# Altium footprint library Connectors.PcbLib: 104 footprints (part 7 of 7)
Each footprint in its own frame and in the unit in brackets; x right, y up, seen from the top. Pads: shape width x height; smd on the part's side, far side on the other; paste and mask are expansions set on the pad; w line width, h text height; cw(c..) or ccw(c..) is an arc to the next point about the centre after c.
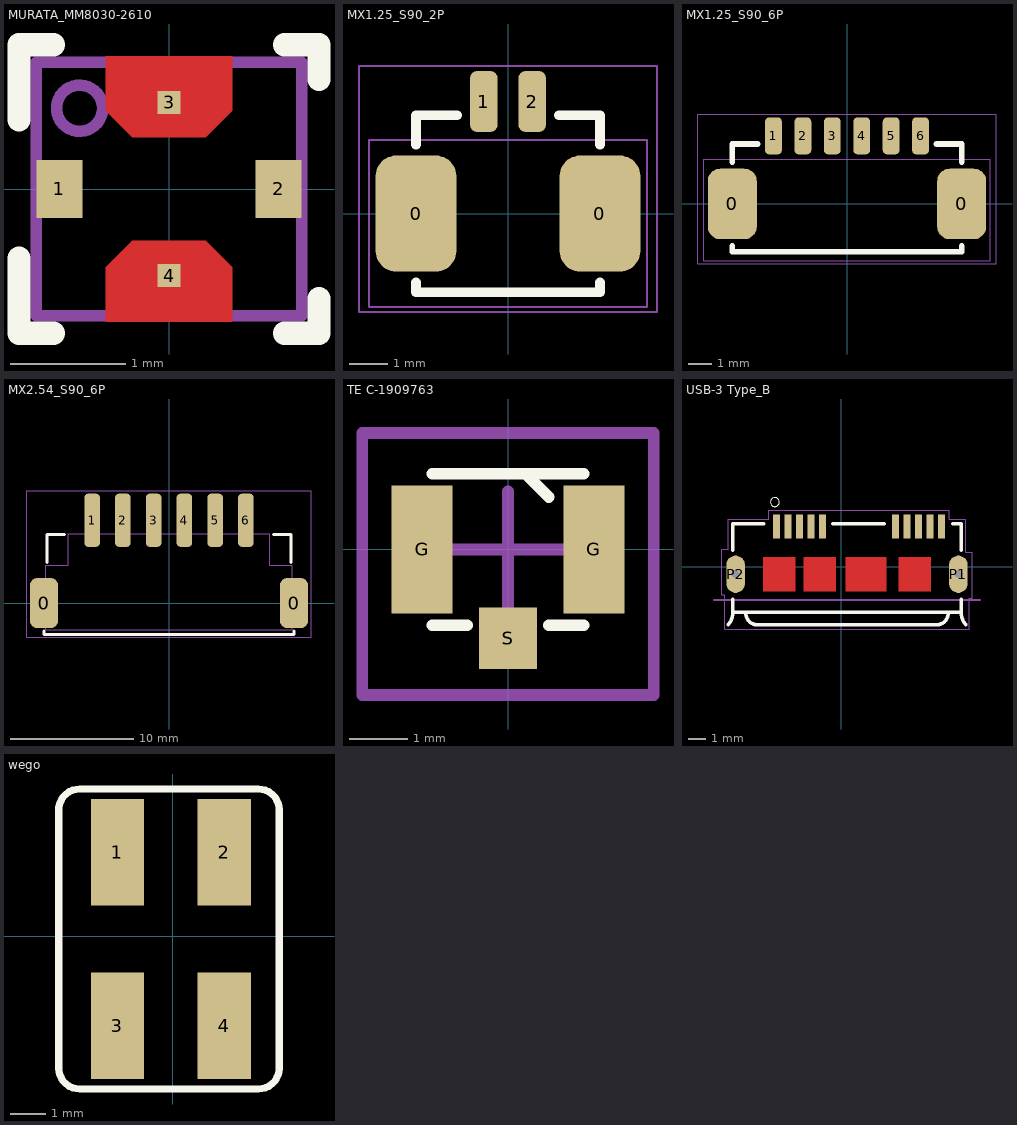
[diagram p6: the footprints below, top view; thin cyan lines are the x and y axes]

## MURATA_MM8030-2610 [mm]
pads (4):
  rect 0.4x0.5 smd paste-0.5: 1(-0.95,0) 2(0.95,0)
  rect 0.2x0.2 smd paste-0.2: 3(0,0.75) 4(0,-0.75)
Top Layer:
  region: -0.32,-0.45 -0.55,-0.68 -0.55,-1.15 0.55,-1.15 0.55,-0.68 0.32,-0.45
  region: -0.32,0.45 -0.55,0.68 -0.55,1.15 0.55,1.15 0.55,0.68 0.32,0.45
Top Overlay:
  lines w0.2: -1.3,-0.6 -1.3,-1.25 -1,-1.25 ; -1.3,0.6 -1.3,1.25 -1,1.25 ; 1,-1.25 1.3,-1.25 1.3,-0.95 ; 1,1.25 1.3,1.25 1.3,0.95
Top Paste:
  rectangle: -1.15,-0.175 -0.8,0.175
  rectangle: 0.8,-0.175 1.15,0.175
  rectangle: -0.5,0.65 0.5,1.15
  rectangle: -0.5,-1.15 0.5,-0.65
Mechanical 5:
  circle w0.1: c-0.775,0.7 r0.2
  lines w0.1: -1.15,-1.1 1.15,-1.1 1.15,1.1 -1.15,1.1 -1.15,-1.1
3D body: height 0.5, standoff 0, extent -1.151,-1.101 1.151,1.101
3D body: height 0.53, standoff 0.51, extent -1.151,-1.101 1.151,1.101
3D body: height 0.54, standoff 0.5, extent -0.674,-0.674 0.674,0.674
3D body: height 1, standoff 0.5, extent -0.674,-0.674 0.674,0.674
3D body: height 0.75, standoff 0.5, extent -0.269,-0.269 0.269,0.269
3D body: height 0.53, standoff 0, extent -0.7,0.6 0.7,1.1
3D body: height 0.53, standoff 0, extent -0.7,-1.1 0.7,-0.6
3D body: height 0.53, standoff 0, extent 0.9,-0.4 1.15,0.4
3D body: height 0.53, standoff 0, extent -1.15,-0.4 -0.9,0.4
3D body: height 0.51, standoff 0.5, extent -1.024,0.7 -0.825,0.9

## MX1.25_S90_2P [mil]
pads (4):
  rrect50% 82x118 smd: 0(-93.58,0) 0(93.58,0)
  rrect50% 28x62 smd: 1(-24.61,114) 2(24.61,114)
Top Overlay:
  lines w10: -93.58,-70 -93.58,-80 93.58,-80 93.58,-70 ; -93.58,70 -93.58,100 -51.58,100 ; 51.58,100 93.58,100 93.58,70
Mechanical 13:
  lines w2: -141.58,-95 -141.58,75 141.58,75 141.58,-95 -141.58,-95
Mechanical 14:
  lines w2: -151.58,-100 -151.58,150 151.58,150 151.58,-100 -151.58,-100
  text ".Designator" at -90,-25 h100
3D body "47641.stp": height 98.43, standoff -23.62, extent -146.65,-128.78 146.65,135

## MX1.25_S90_6P [mil]
pads (8):
  rrect50% 82x118 smd: 0(-192,0) 0(192,0)
  rrect50% 28x62 smd: 1(-123.03,114) 2(-73.82,114) 3(-24.61,114) 4(24.61,114) 5(73.82,114) 6(123.03,114)
Top Overlay:
  lines w10: -192,-70 -192,-80 192,-80 192,-70 ; -192,70 -192,100 -150,100 ; 150,100 192,100 192,70
Mechanical 13:
  lines w2: -240,-95 240,-95 240,75 -240,75 -240,-95
Mechanical 14:
  lines w2: -250,-100 250,-100 250,150 -250,150 -250,-100
  text ".Designator" at -90,-5 h100
3D body "47654.stp": height 98.43, standoff -15.75, extent -245.08,-130 245.08,133.78

## MX2.54_S90_6P [mil]
pads (8):
  rrect50% 90x160 smd: 0(-400,0) 0(400,0)
  rrect50% 50x170 smd: 1(-246.06,265) 2(-147.64,265) 3(-49.21,265) 4(49.21,265) 5(147.64,265) 6(246.06,265)
Top Overlay:
  lines w10: -400,-90 -400,-100 400,-100 400,-90 ; -390,130 -390,220 -335,220 ; 335,220 390,220 390,130
Mechanical 13:
  lines w2: -393.7,-85 393.7,-85 393.7,121.69 322.83,121.69 322.83,222.09 -322.83,222.09 -322.83,121.69 -393.7,121.69 -393.7,-85
Mechanical 14:
  lines w2: -455,-110 -455,360 455,360 455,-110 -455,-110
  text ".Designator" at -90,75 h100

## TE C-1909763 [mm]
height 1.25
pads (3):
  rect 1.05x2.2 smd: G(-1.475,0) G(1.475,0)
  rect 1x1.05 smd: S(0,-1.525)
Top Overlay:
  lines w0.2: -1.3,-1.3 -0.7,-1.3 ; -1.3,1.3 1.3,1.3 ; 0.3,1.3 0.7,0.9 ; 0.7,-1.3 1.3,-1.3
Mechanical 15:
  lines w0.2: -1,0 1,0 ; 0,-1 0,1 ; -2.5,-2.5 -2.5,2 2.5,2 2.5,-2.5 -2.5,-2.5
3D body "TE 1909763-1.STEP": height 1.23, standoff 0, extent -1.5,-1.55 1.5,1.55

## USB-3 Type_B [mm]
pads (12):
  rect 0.4x1.35 smd: 1(-3.658,2.264) 2(-3.008,2.264) 3(-2.358,2.264) 4(-1.708,2.264) 5(-1.058,2.264) 6(3.042,2.264) 7(3.692,2.264) 8(4.342,2.264) 9(4.992,2.264) 10(5.642,2.264)
  oval 1.05x2.1 hole 0.45: P1(6.592,-0.411) P2(-5.958,-0.411)
Top Layer:
  region: 3.243,0.539 5.042,0.539 5.042,-1.361 3.243,-1.361
  region: 0.242,0.539 2.542,0.539 2.542,-1.361 0.242,-1.361
  region: -2.109,0.539 -0.308,0.539 -0.308,-1.362 -2.109,-1.362
  region: -4.414,0.539 -2.608,0.539 -2.608,-1.362 -4.414,-1.362
Top Overlay:
  circle w0: c-3.747,3.653 r0.254
  lines w0.2: -6.379,-3.257 ccw(c-7.121,-2.565) -6.108,-2.512 ; -6.108,-1.811 -6.108,-2.511 -6.108,-2.561 -5.383,-2.561 6.017,-2.561 6.742,-2.561 6.742,-2.511 6.742,-1.811 ; -6.108,0.939 -6.108,2.439 -4.383,2.439 ; -5.383,-2.566 ccw(c-4.733,-2.611) -4.778,-3.261 ; -4.783,-3.261 5.417,-3.261 ; -0.483,2.439 2.417,2.439 ; 5.412,-3.261 ccw(c5.367,-2.611) 6.017,-2.566 ; 6.267,2.439 6.742,2.439 6.742,0.939 ; 6.742,-2.512 ccw(c7.755,-2.565) 7.013,-3.257
Top Paste:
  region: 3.245,0.539 5.042,0.539 5.042,-1.362 3.245,-1.362
  region: 0.242,0.539 2.542,0.539 2.542,-1.362 0.242,-1.362
  region: -2.109,0.539 -0.308,0.539 -0.308,-1.361 -2.109,-1.361
  region: -4.409,0.539 -2.608,0.539 -2.608,-1.361 -4.409,-1.361
Top Solder:
  region: 3.045,0.689 5.242,0.689 5.242,-1.512 3.045,-1.512
  region: 0.042,0.689 2.742,0.689 2.742,-1.513 0.042,-1.513
  region: -2.259,0.689 -0.158,0.689 -0.158,-1.511 -2.259,-1.511
  region: -4.558,0.689 -2.458,0.689 -2.458,-1.511 -4.558,-1.511
Mechanical 1:
  lines w0: -6.183,-0.811 ccw(c-5.958,-0.811) -5.958,-1.036 ccw(c-5.958,-0.811) -5.733,-0.811 -5.733,-0.011 ccw(c-5.958,-0.011) -5.958,0.214 ccw(c-5.958,-0.011) -6.183,-0.011 -6.183,-0.811 ; 6.367,-0.811 ccw(c6.592,-0.811) 6.592,-1.036 ccw(c6.592,-0.811) 6.817,-0.811 6.817,-0.011 ccw(c6.592,-0.011) 6.592,0.214 ccw(c6.592,-0.011) 6.367,-0.011 6.367,-0.811
  lines w0.05: -6.733,-1.561 -6.733,0.989 -6.383,0.989 -6.383,2.689 -4.083,2.689 -4.083,3.189 6.067,3.189 6.067,2.689 7.017,2.689 7.017,0.839 7.367,0.839 7.367,-1.761 7.217,-1.761 7.217,-3.511 -6.583,-3.511 -6.583,-1.561 -6.733,-1.561
  lines w0.1: -7.183,-1.861 7.817,-1.861
3D body "USB3120-30-A_revD.STEP": height 2.78, standoff -0.95, extent -6.336,-3.521 7.05,2.421

## wego [mm]
pads (4):
  rect 1.5x3 smd: 1(-1.549,2.362) 2(1.448,2.362) 3(-1.549,-2.515) 4(1.448,-2.515)
Top Overlay:
  lines w0.2: -3.2,3.556 cw(c-2.616,3.556) -2.616,4.14 2.413,4.14 cw(c2.413,3.556) 2.997,3.556 2.997,-3.708 cw(c2.413,-3.708) 2.413,-4.293 -2.616,-4.293 cw(c-2.616,-3.708) -3.2,-3.708 -3.2,3.632
3D body "2059-302_998-403.stp": height 2.65, standoff -0.05, extent -3.048,-3.976 2.852,3.874

## ZBUF_3DMODEL [mm]
3D body "47631.stp": height 2.5, standoff -0.6, extent -5.248,8.133 12.202,14.833
3D body "47659.stp": height 2.5, standoff -0.6, extent -3.284,-0.477 11.666,6.223
3D body "47641.stp": height 2.5, standoff -0.6, extent 3.895,-8.763 11.345,-2.063